# Altium footprint library PCB_GENERAL.PcbLib: 226 footprints (part 11 of 15)
Each footprint in its own frame and in the unit in brackets; x right, y up, seen from the top. Pads: shape width x height; smd on the part's side, far side on the other; paste and mask are expansions set on the pad; w line width, h text height; cw(c..) or ccw(c..) is an arc to the next point about the centre after c.
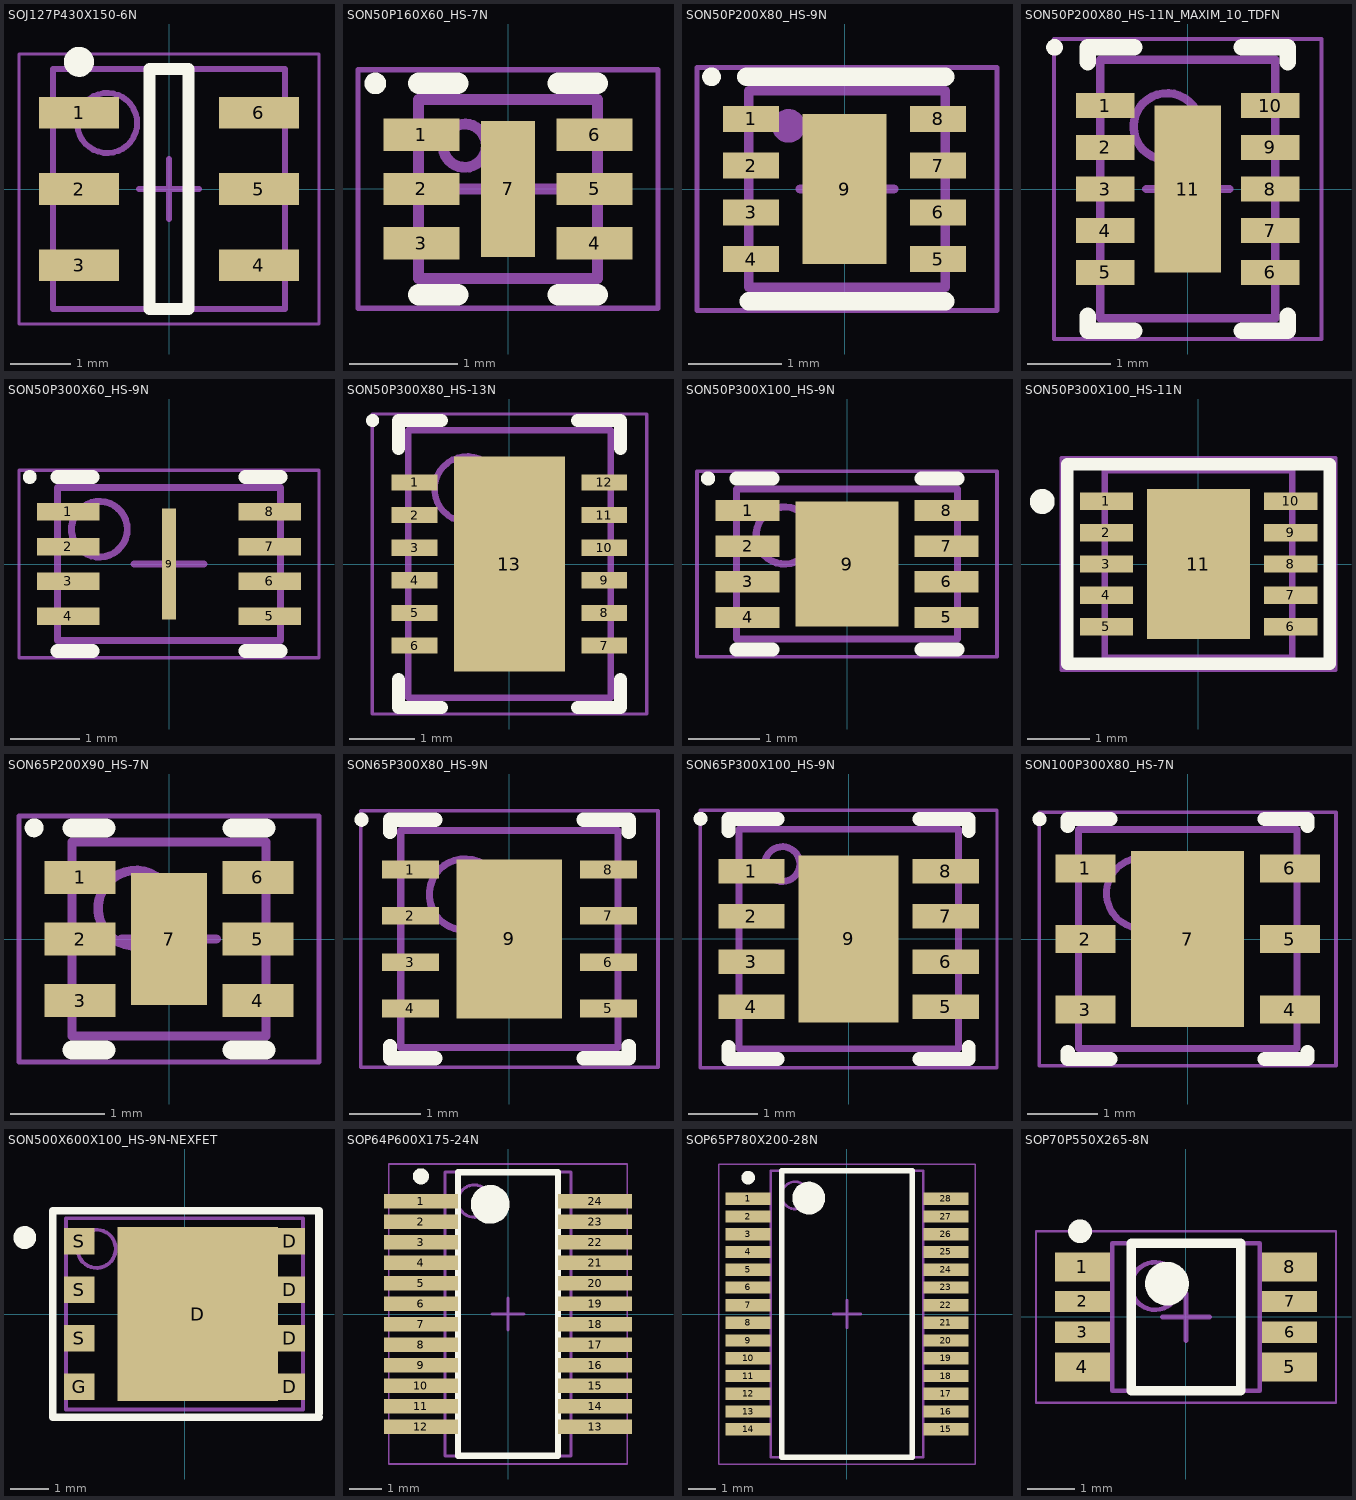
[diagram p10: the footprints below, top view; thin cyan lines are the x and y axes]

## SOJ127P430X150-6N [mm] "SOJ, 6-Leads, Body 4,00x4,29mm, Pitch 1,27mm, IPC Medium Density"
height 1.5
pads (6):
  rect 1.33x0.53 smd: 1(-1.5,1.27) 2(-1.5,0) 3(-1.5,-1.27) 4(1.5,-1.27) 5(1.5,0) 6(1.5,1.27)
Top Overlay:
  circle w0.25: c-1.5,2.12 r0.125
  lines w0.2: -0.325,-2 -0.325,2 0.325,2 0.325,-2 -0.325,-2
Mechanical 11:
  text ".Designator" at -0.67,-0.23 h1.52
Mechanical 14:
  circle w0.1: c-1.03,1.1 r0.5
  lines w0.1: -1.93,-2 -1.93,2 1.93,2 1.93,-2 -1.93,-2
Mechanical 15:
  lines w0.05: -2.5,-2.25 -2.5,2.25 2.5,2.25 2.5,-2.25 -2.5,-2.25
  lines w0.1: -0.5,0 0.5,0 ; 0,-0.5 0,0.5
3D body "SOJ127P430X150-6N.step": height 1.5, standoff 0, extent -2.348,-2 2.348,2

## SON50P160X60_HS-7N [mm] "SON, 6-Leads, Body 1,60x1,60mm, Pitch 0,50mm, Thermal Pad 1,26x0,33mm, IPC Medium Density"
height 0.6
pads (7):
  rect 0.7x0.3 smd: 1(-0.8,0.5) 2(-0.8,0) 3(-0.8,-0.5) 4(0.8,-0.5) 5(0.8,0) 6(0.8,0.5)
  rect 0.5x1.26 smd: 7(0,0)
Top Overlay:
  circle w0.1: c-1.225,0.975 r0.05
  lines w0.2: -0.825,-0.975 -0.465,-0.975 ; -0.825,0.975 -0.465,0.975 ; 0.465,-0.975 0.825,-0.975 ; 0.465,0.975 0.825,0.975
Mechanical 11:
  text ".Designator" at -0.95,-0.075 h1
Mechanical 14:
  circle w0.1: c-0.4,0.4 r0.2
  lines w0.1: -0.825,-0.825 0.825,-0.825 0.825,0.825 -0.825,0.825 -0.825,-0.825
Mechanical 15:
  lines w0.05: -1.385,-1.1 1.385,-1.1 1.385,1.1 -1.385,1.1 -1.385,-1.1
  lines w0.1: -0.5,0 0.5,0 ; 0,-0.5 0,0.5
3D body: height 0.6, standoff 0.05, extent -0.825,-0.825 0.825,0.825

## SON50P200X80_HS-9N [mm] "SON, 8-Leads, Body 2.00x2.00mm, Pitch 0.50mm, Thermal Pad 1.60x0.69mm, IPC Medium Density"
height 0.8
pads (9):
  rect 0.6x0.28 smd: 1(-1,0.75) 2(-1,0.25) 3(-1,-0.25) 4(-1,-0.75) 5(1,-0.75) 6(1,-0.25) 7(1,0.25) 8(1,0.75)
  rect 0.9x1.6 smd: 9(0,0)
Top Overlay:
  circle w0.1: c-1.425,1.2 r0.05
  lines w0.2: -1.05,1.2 0.67,1.2 1.075,1.2 ; -1.025,-1.2 0.67,-1.2 1.075,-1.2
Mechanical 11:
  text ".Designator" at -1.45,1.575 h1
Mechanical 14:
  circle w0.2: c-0.6,0.675 r0.079
  lines w0.1: -1.025,-1.05 -1.025,1.05 1.075,1.05 1.075,-1.05 -1.025,-1.05
Mechanical 15:
  lines w0.05: -1.58,-1.3 -1.58,1.3 1.63,1.3 1.63,-1.3 -1.58,-1.3
  lines w0.1: -0.475,0 0.525,0 ; 0.025,-0.5 0.025,0.5
3D body: height 0.8, standoff 0, extent -1.025,-1.05 1.075,1.05

## SON50P200X80_HS-11N_MAXIM_10_TDFN [mm] "SON, 10-Leads, Body 3,00x2,00mm, Pitch 0,50mm, Thermal Pad 2,00x0,69mm, IPC Medium Density"
height 0.8
pads (11):
  rect 0.7x0.3 smd: 1(-0.99,1) 2(-0.99,0.5) 3(-0.99,0) 4(-0.99,-0.5) 5(-0.99,-1) 6(0.99,-1) 7(0.99,-0.5) 8(0.99,0) 9(0.99,0.5) 10(0.99,1)
  rect 0.8x2 smd: 11(0,0)
Top Overlay:
  circle w0.1: c-1.6,1.7 r0.05
  lines w0.2: -1.2,-1.525 -1.2,-1.7 -0.645,-1.7 ; -1.2,1.525 -1.2,1.7 -0.645,1.7 ; 0.645,-1.7 1.2,-1.7 1.2,-1.525 ; 0.645,1.7 1.2,1.7 1.2,1.525
Mechanical 11:
  text ".Designator" at -1.2,-0.6 h1.52
Mechanical 14:
  circle w0.1: c-0.25,0.75 r0.4
  lines w0.1: -1.05,-1.55 1.05,-1.55 1.05,1.55 -1.05,1.55 -1.05,-1.55
Mechanical 15:
  lines w0.05: -1.605,-1.8 1.605,-1.8 1.605,1.8 -1.605,1.8 -1.605,-1.8
  lines w0.1: -0.5,0 0.5,0 ; 0,-0.5 0,0.5
3D body "SON50P200X80_HS-11N.step": height 0.8, standoff 0, extent -1.051,-1.55 1.051,1.55

## SON50P300X60_HS-9N [mm] "SON, 8-Leads, Body 2,00x3,00mm, Pitch 0,50mm, Thermal Pad 1,60x0,20mm, IPC Medium Density"
height 0.6
pads (9):
  rect 0.9x0.25 smd: 1(-1.445,0.75) 2(-1.445,0.25) 3(-1.445,-0.25) 4(-1.445,-0.75) 5(1.445,-0.75) 6(1.445,-0.25) 7(1.445,0.25) 8(1.445,0.75)
  rect 0.2x1.6 smd paste-0.1 mask+0: 9(0,0)
Top Overlay:
  circle w0.1: c-2,1.25 r0.05
  lines w0.2: -1.6,-1.25 -1.095,-1.25 ; -1.6,1.25 -1.095,1.25 ; 1.095,-1.25 1.6,-1.25 ; 1.095,1.25 1.6,1.25
Mechanical 11:
  text ".Designator" at -1.1,-0.225 h1
Mechanical 14:
  circle w0.1: c-1,0.5 r0.4
  lines w0.1: -1.6,-1.1 1.6,-1.1 1.6,1.1 -1.6,1.1 -1.6,-1.1
Mechanical 15:
  lines w0.05: -2.155,-1.35 2.155,-1.35 2.155,1.35 -2.155,1.35 -2.155,-1.35
  lines w0.1: -0.5,0 0.5,0 ; 0,-0.5 0,0.5
3D body: height 0.6, standoff 0.05, extent -1.6,-1.1 1.6,1.1

## SON50P300X80_HS-13N [mm] "SON, 12-Leads, Body 4,00x3,00mm, Pitch 0,50mm, Thermal Pad 3,30x1,49mm, IPC Medium Density"
height 0.8
pads (13):
  rect 0.7x0.25 smd: 1(-1.455,1.25) 2(-1.455,0.75) 3(-1.455,0.25) 4(-1.455,-0.25) 5(-1.455,-0.75) 6(-1.455,-1.25) 7(1.455,-1.25) 8(1.455,-0.75) 9(1.455,-0.25) 10(1.455,0.25) 11(1.455,0.75) 12(1.455,1.25)
  rect 1.7x3.3 smd: 13(0,0)
Top Overlay:
  circle w0.1: c-2.1,2.2 r0.05
  lines w0.2: -1.7,-1.775 -1.7,-2.2 -1.045,-2.2 ; -1.7,1.775 -1.7,2.2 -1.045,2.2 ; 1.045,-2.2 1.7,-2.2 1.7,-1.775 ; 1.045,2.2 1.7,2.2 1.7,1.775
Mechanical 11:
  text ".Designator" at -0.7,-0.5 h1.52
Mechanical 14:
  circle w0.1: c-0.65,1.15 r0.5
  lines w0.1: -1.55,-2.05 -1.55,2.05 1.55,2.05 1.55,-2.05 -1.55,-2.05
Mechanical 15:
  lines w0.05: -2.105,-2.3 -2.105,2.3 2.105,2.3 2.105,-2.3 -2.105,-2.3
  lines w0.1: -0.5,0 0.5,0 ; 0,-0.5 0,0.5
3D body "SON50P300X80_HS-13N.step": height 0.8, standoff 0, extent -1.551,-2.05 1.551,2.05

## SON50P300X100_HS-9N [mm] "SON, 8-Leads, Body 2,00x3,00mm, Pitch 0,50mm, Thermal Pad 1,53x1,49mm, IPC Medium Density"
height 1
pads (9):
  rect 0.9x0.3 smd: 1(-1.395,0.75) 2(-1.395,0.25) 3(-1.395,-0.25) 4(-1.395,-0.75) 5(1.395,-0.75) 6(1.395,-0.25) 7(1.395,0.25) 8(1.395,0.75)
  rect 1.45x1.75 smd: 9(0,0)
Top Overlay:
  circle w0.1: c-1.95,1.2 r0.05
  lines w0.2: -1.55,-1.2 -1.045,-1.2 ; -1.55,1.2 -1.045,1.2 ; 1.045,-1.2 1.55,-1.2 ; 1.045,1.2 1.55,1.2
Mechanical 11:
  text ".Designator" at -0.85,-0.225 h1
Mechanical 14:
  circle w0.1: c-0.875,0.4 r0.4
  lines w0.1: -1.55,-1.05 -1.55,1.05 1.55,1.05 1.55,-1.05 -1.55,-1.05
Mechanical 15:
  lines w0.05: -2.105,-1.3 -2.105,1.3 2.105,1.3 2.105,-1.3 -2.105,-1.3
  lines w0.1: -0.5,0 0.5,0 ; 0,-0.5 0,0.5
3D body "SON50P300X100_HS-9N.step": height 1, standoff 0, extent -1.551,-1.05 1.551,1.05

## SON50P300X100_HS-11N [mm]
pads (11):
  rect 0.85x0.28 smd: 1(-1.475,1) 2(-1.475,0.5) 3(-1.475,0) 4(-1.475,-0.5) 5(-1.475,-1) 6(1.475,-1) 7(1.475,-0.5) 8(1.475,0) 9(1.475,0.5) 10(1.475,1)
  rect 1.65x2.4 smd paste-10: 11(0,0)
Top Overlay:
  circle w0.2: c-2.5,1 r0.1
  lines w0.2: -2.1,-1.6 -2.1,1.6 2.1,1.6 2.1,-1.6 -2.1,-1.6
  text ".Designator" at 5.9,-2.8 h1
Top Paste:
  region: 0.05,1.1 0.05,0.05 0.75,0.05 0.75,1.1
  region: -0.75,1.1 -0.75,0.05 -0.05,0.05 -0.05,1.1
  region: -0.75,-0.05 -0.75,-1.1 -0.05,-1.1 -0.05,-0.05
  region: 0.05,-0.05 0.05,-1.1 0.75,-1.1 0.75,-0.05
Mechanical 14:
  lines w0.1: -1.5,-1.5 1.5,-1.5 1.5,1.5 -1.5,1.5 -1.5,-1.5
Mechanical 15:
  lines w0.05: -0.5,0 0.5,0 ; 0,-0.5 0,0.5 ; -2.2,-1.7 2.2,-1.7 2.2,1.7 -2.2,1.7 -2.2,-1.7
3D body "SW3dPS-SON10-3x3mm.STEP": height 0.92, standoff 0.02, extent -1.5,-1.5 1.5,1.5

## SON65P200X90_HS-7N [mm] "SON, 6-Leads, Body 2,00x2,00mm, Pitch 0,65mm, Thermal Pad 1,40x0,73mm, IPC Medium Density"
height 0.9
pads (7):
  rect 0.75x0.35 smd: 1(-0.94,0.65) 2(-0.94,0) 3(-0.94,-0.65) 4(0.94,-0.65) 5(0.94,0) 6(0.94,0.65)
  rect 0.8x1.4 smd: 7(0,0)
Top Overlay:
  circle w0.1: c-1.425,1.175 r0.05
  lines w0.2: -1.025,-1.175 -0.665,-1.175 ; -1.025,1.175 -0.665,1.175 ; 0.665,-1.175 1.025,-1.175 ; 0.665,1.175 1.025,1.175
Mechanical 11:
  text ".Designator" at -0.425,-0.025 h1
Mechanical 14:
  circle w0.1: c-0.35,0.325 r0.4
  lines w0.1: -1.025,-1.025 -1.025,1.025 1.025,1.025 1.025,-1.025 -1.025,-1.025
Mechanical 15:
  lines w0.05: -1.585,-1.3 -1.585,1.3 1.585,1.3 1.585,-1.3 -1.585,-1.3
  lines w0.1: -0.5,0 0.5,0 ; 0,-0.5 0,0.5
3D body: height 0.9, standoff 0, extent -1.025,-1.025 1.025,1.025

## SON65P300X80_HS-9N [mm] "SON, 8-Leads, Body 3,00x3,00mm, Pitch 0,65mm, Thermal Pad 2,23x1,48mm, IPC Medium Density"
height 0.8
pads (9):
  rect 0.8x0.25 smd: 1(-1.39,0.975) 2(-1.39,0.325) 3(-1.39,-0.325) 4(-1.39,-0.975) 5(1.39,-0.975) 6(1.39,-0.325) 7(1.39,0.325) 8(1.39,0.975)
  rect 1.48x2.23 smd: 9(0,0)
Top Overlay:
  circle w0.1: c-2.075,1.675 r0.05
  lines w0.2: -1.675,-1.5 -1.675,-1.675 -1.04,-1.675 ; -1.675,1.5 -1.675,1.675 -1.04,1.675 ; 1.04,-1.675 1.675,-1.675 1.675,-1.5 ; 1.04,1.675 1.675,1.675 1.675,1.5
Mechanical 11:
  text ".Designator" at -1.1,-0.225 h1
Mechanical 14:
  circle w0.1: c-0.625,0.625 r0.5
  lines w0.1: -1.525,-1.525 1.525,-1.525 1.525,1.525 -1.525,1.525 -1.525,-1.525
Mechanical 15:
  lines w0.05: -2.085,-1.8 2.085,-1.8 2.085,1.8 -2.085,1.8 -2.085,-1.8
  lines w0.1: -0.5,0 0.5,0 ; 0,-0.5 0,0.5
3D body "SON65P300X80_HS-9N.step": height 0.8, standoff 0, extent -1.526,-1.525 1.526,1.525

## SON65P300X100_HS-9N [mm] "SON, 8-Leads, Body 3.50x3.00mm, Pitch 0.65mm, Thermal Pad 2.40x1.44mm, IPC Medium Density"
height 1
pads (9):
  rect 0.95x0.35 smd: 1(-1.395,0.975) 2(-1.395,0.325) 3(-1.395,-0.325) 4(-1.395,-0.975) 5(1.395,-0.975) 6(1.395,-0.325) 7(1.395,0.325) 8(1.395,0.975)
  rect 1.44x2.4 smd: 9(0,0)
Top Overlay:
  circle w0.1: c-2.125,1.725 r0.05
  lines w0.2: -1.725,-1.55 -1.725,-1.725 -1.02,-1.725 ; -1.725,1.55 -1.725,1.725 -1.02,1.725 ; 1.02,-1.725 1.725,-1.725 1.725,-1.55 ; 1.02,1.725 1.725,1.725 1.725,1.55
Mechanical 11:
  text ".Designator" at -1.975,2.2 h1
Mechanical 14:
  circle w0.1: c-0.95,1.075 r0.25
  lines w0.1: -1.575,-1.575 -1.575,1.575 1.575,1.575 1.575,-1.575 -1.575,-1.575
Mechanical 15:
  lines w0.05: -2.13,-1.85 2.13,-1.85 2.13,1.85 -2.13,1.85 -2.13,-1.85
  lines w0.1: -0.5,0 0.5,0 ; 0,-0.5 0,0.5
3D body: height 1, standoff 0, extent -1.575,-1.575 1.575,1.575

## SON100P300X80_HS-7N [mm] "SON, 6-Leads, Body 3,00x3,00mm, Pitch 1,00mm, Thermal Pad 2,40x1,50mm, IPC Medium Density"
height 0.8
pads (7):
  rect 0.85x0.4 smd: 1(-1.45,1) 2(-1.45,0) 3(-1.45,-1) 4(1.45,-1) 5(1.45,0) 6(1.45,1)
  rect 1.6x2.5 smd: 7(0,0)
Top Overlay:
  circle w0.1: c-2.1,1.7 r0.05
  lines w0.2: -1.7,-1.6 -1.7,-1.7 -1.095,-1.7 ; -1.7,1.6 -1.7,1.7 -1.095,1.7 ; 1.095,-1.7 1.7,-1.7 1.7,-1.6 ; 1.095,1.7 1.7,1.7 1.7,1.6
Mechanical 11:
  text ".Designator" at -1,0.1 h1
Mechanical 14:
  circle w0.1: c-0.65,0.65 r0.5
  lines w0.1: -1.55,-1.55 -1.55,1.55 1.55,1.55 1.55,-1.55 -1.55,-1.55
Mechanical 15:
  lines w0.05: -2.105,-1.8 -2.105,1.8 2.105,1.8 2.105,-1.8 -2.105,-1.8
  lines w0.1: -0.5,0 0.5,0 ; 0,-0.5 0,0.5
3D body "SON100P300X80_HS-7N.step": height 0.8, standoff 0, extent -1.551,-1.55 1.551,1.55

## SON500X600X100_HS-9N-NEXFET [mm] "SON 5X6mm NEXFET"
height 1
pads (9):
  rect 4.2x4.56 smd: D(0.347,0)
  rect 0.8x0.7 smd: D(2.753,-1.905) D(2.753,-0.635) D(2.753,0.635) D(2.753,1.905) G(-2.752,-1.905) S(-2.752,-0.635) S(-2.752,0.635) S(-2.752,1.905)
Top Overlay:
  circle w0.3: c-4.182,2 r0.15
  lines w0.2: 3.518,-2.7 -3.453,-2.7 -3.453,2.7 3.518,2.7 3.518,-2.6
Mechanical 11:
  text ".Designator" at -2.682,-0.2 h1
Mechanical 14:
  circle w0.1: c-2.302,1.705 r0.5
  lines w0.1: -3.102,-2.495 -3.102,2.505 3.097,2.505 3.097,-2.495 -3.102,-2.495
Mechanical 15:
  lines w0.05: -0.5,0 0.5,0 ; 0,-0.5 0,0.5 ; -3.453,-2.7 3.518,-2.7 3.518,2.7 -3.453,2.7 -3.453,-2.7
3D body "User Library-PowerPAK SO-8 (S).step": height 1.04, standoff 0, extent -3.157,-2.575 2.993,2.575

## SOP64P600X175-24N [mm] "SOP, 24-Leads, Body 8,66x3,91mm, Pitch 0,64mm, IPC Medium Density"
height 1.75
pads (24):
  rect 2.3x0.45 smd: 1(-2.7,3.492) 2(-2.7,2.857) 3(-2.7,2.222) 4(-2.7,1.587) 5(-2.7,0.953) 6(-2.7,0.318) 7(-2.7,-0.318) 8(-2.7,-0.953) 9(-2.7,-1.587) 10(-2.7,-2.222) 11(-2.7,-2.857) 12(-2.7,-3.492) 13(2.7,-3.492) 14(2.7,-2.857) 15(2.7,-2.222) 16(2.7,-1.587) 17(2.7,-0.953) 18(2.7,-0.318) 19(2.7,0.318) 20(2.7,0.953) 21(2.7,1.587) 22(2.7,2.222) 23(2.7,2.857) 24(2.7,3.492)
Top Overlay:
  circle w0.6: c-0.55,3.4 r0.3
  circle w0.25: c-2.7,4.267 r0.125
  lines w0.2: -1.55,-4.4 1.55,-4.4 1.55,4.4 -1.55,4.4 -1.55,-4.4
Mechanical 11:
  text ".Designator" at -4.9,5.225 h1
Mechanical 14:
  circle w0.1: c-1.05,3.5 r0.5
  lines w0.1: -1.95,-4.4 1.95,-4.4 1.95,4.4 -1.95,4.4 -1.95,-4.4
Mechanical 15:
  lines w0.05: -3.7,-4.65 3.7,-4.65 3.7,4.65 -3.7,4.65 -3.7,-4.65
  lines w0.1: -0.5,0 0.5,0 ; 0,-0.5 0,0.5
3D body "SOP64P600X175-24N.step": height 1.75, standoff 0, extent -2.995,-4.4 2.995,4.4

## SOP65P780X200-28N [mm] "SOP, 28-Leads, Body 10,20x5,30mm, Pitch 0,65mm, IPC Medium Density"
height 2
pads (28):
  rect 1.65x0.45 smd: 1(-3.625,4.225) 2(-3.625,3.575) 3(-3.625,2.925) 4(-3.625,2.275) 5(-3.625,1.625) 6(-3.625,0.975) 7(-3.625,0.325) 8(-3.625,-0.325) 9(-3.625,-0.975) 10(-3.625,-1.625) 11(-3.625,-2.275) 12(-3.625,-2.925) 13(-3.625,-3.575) 14(-3.625,-4.225) 15(3.625,-4.225) 16(3.625,-3.575) 17(3.625,-2.925) 18(3.625,-2.275) 19(3.625,-1.625) 20(3.625,-0.975) 21(3.625,-0.325) 22(3.625,0.325) 23(3.625,0.975) 24(3.625,1.625) 25(3.625,2.275) 26(3.625,2.925) 27(3.625,3.575) 28(3.625,4.225)
Top Overlay:
  circle w0.25: c-3.625,5 r0.125
  circle w0.6: c-1.4,4.25 r0.3
  lines w0.2: -2.4,-5.25 -2.4,5.25 2.4,5.25 2.4,-5.25 -2.4,-5.25
Mechanical 11:
  text ".Designator" at -0.675,-0.41 h1
Mechanical 14:
  circle w0.1: c-1.9,4.35 r0.5
  lines w0.1: -2.8,-5.25 -2.8,5.25 2.8,5.25 2.8,-5.25 -2.8,-5.25
Mechanical 15:
  lines w0.05: -4.7,-5.5 -4.7,5.5 4.7,5.5 4.7,-5.5 -4.7,-5.5
  lines w0.1: -0.5,0 0.5,0 ; 0,-0.5 0,0.5
3D body "SOP65P780X200-28N.step": height 2, standoff 0, extent -3.9,-5.25 3.9,5.25

## SOP70P550X265-8N [mm] "SOP, 8-Leads, Body 3,60x3,60mm, Pitch 0,70mm, IPC Medium Density"
height 2.65
pads (8):
  rect 1.15x0.6 smd: 1(-2.175,1.05) 4(-2.175,-1.05) 5(2.175,-1.05) 8(2.175,1.05)
  rect 1.15x0.45 smd: 2(-2.175,0.325) 3(-2.175,-0.325) 6(2.175,-0.325) 7(2.175,0.325)
Top Overlay:
  circle w0.25: c-2.225,1.8 r0.125
  circle w0.6: c-0.4,0.7 r0.158
  lines w0.2: -1.15,-1.55 -1.15,1.55 1.15,1.55 1.15,-1.55 -1.15,-1.55
Mechanical 11:
  text ".Designator" at -1.4,0.2 h1
Mechanical 14:
  circle w0.1: c-0.65,0.65 r0.5
  lines w0.1: -1.55,-1.55 -1.55,1.55 1.55,1.55 1.55,-1.55 -1.55,-1.55
Mechanical 15:
  lines w0.05: -3.15,-1.8 -3.15,1.8 3.15,1.8 3.15,-1.8 -3.15,-1.8
  lines w0.1: -0.5,0 0.5,0 ; 0,-0.5 0,0.5
3D body "TSOP65P490X110-8N.step": height 1.1, standoff 0, extent -2.45,-1.55 2.45,1.55